# Altium schematic symbol library jlcpcb_2025_04_ferrites_extended_0603.schlib: 833 symbols (part 1 of 4) (continued)
## BLM18AG601BH1D
designator FB?  Impedance @ Frequency: 600Ω@100MHz
Ferrite, 600Ω@100MHz, ±25%, 380mΩ, 500mA, SMD 0603; Manufacturer: Murata Electronics; Manufacturer Part Number: BLM18AG601BH1D; Package Size: 0603; JLCPCB Basic Part: No; JLCPCB Part Number: C560054; Supplier 1: LCSC; Category: Ferrite Beads; Supplier Part Number 1: C560054; Tolerance: ±25%; Rated Current: 500mA; DC Resistance: 380mΩ; RoHS: Yes; ComponentLink1Description: Datasheet; ComponentLink1URL: https://wmsc.lcsc.com/wmsc/upload/file/pdf/v2/lcsc/2304140030_Murata-Electronics-BLM18AG601BH1D_C560054.pdf; ComponentLink2Description: JLCPCB Part URL; ComponentLink2URL: https://jlcpcb.com/partdetail/C560054; ComponentLink3Description: LCSC Part URL; ComponentLink3URL: https://lcsc.com/product-detail/Ferrite-Beads_Murata-Electronics-Murata-Electronics-BLM18AG601BH1D_C560054.html
footprint FB-0603 (0603 (1608M) Ferrite)
pins: 1, 2

## BLM18AG601SH1D
designator FB?  Impedance @ Frequency: 600Ω@100MHz
Ferrite, 600Ω@100MHz, ±25%, 380mΩ, 500mA, SMD 0603; Manufacturer: Murata Electronics; Manufacturer Part Number: BLM18AG601SH1D; Package Size: 0603; JLCPCB Basic Part: No; JLCPCB Part Number: C73225; Supplier 1: LCSC; Category: Ferrite Beads; Supplier Part Number 1: C73225; Tolerance: ±25%; Rated Current: 500mA; DC Resistance: 380mΩ; RoHS: Yes; ComponentLink1Description: Datasheet; ComponentLink1URL: https://wmsc.lcsc.com/wmsc/upload/file/pdf/v2/lcsc/1810311126_Murata-Electronics-BLM18AG601SH1D_C73225.pdf; ComponentLink2Description: JLCPCB Part URL; ComponentLink2URL: https://jlcpcb.com/partdetail/C73225; ComponentLink3Description: LCSC Part URL; ComponentLink3URL: https://lcsc.com/product-detail/Ferrite-Beads_Murata-Electronics-Murata-Electronics-BLM18AG601SH1D_C73225.html
footprint FB-0603 (0603 (1608M) Ferrite)
pins: 1, 2

## BLM18AG601SN1D
designator FB?  Impedance @ Frequency: 600Ω@100MHz
Ferrite, 600Ω@100MHz, ±25%, 380mΩ, 500mA, SMD 0603; Manufacturer: Murata Electronics; Manufacturer Part Number: BLM18AG601SN1D; Package Size: 0603; JLCPCB Basic Part: No; JLCPCB Part Number: C19330; Supplier 1: LCSC; Category: Ferrite Beads; Supplier Part Number 1: C19330; Tolerance: ±25%; Rated Current: 500mA; DC Resistance: 380mΩ; RoHS: Yes; ComponentLink1Description: Datasheet; ComponentLink1URL: https://wmsc.lcsc.com/wmsc/upload/file/pdf/v2/lcsc/2304140030_Murata-Electronics-BLM18AG601SN1D_C19330.pdf; ComponentLink2Description: JLCPCB Part URL; ComponentLink2URL: https://jlcpcb.com/partdetail/C19330; ComponentLink3Description: LCSC Part URL; ComponentLink3URL: https://lcsc.com/product-detail/Ferrite-Beads_Murata-Electronics-Murata-Electronics-BLM18AG601SN1D_C19330.html
footprint FB-0603 (0603 (1608M) Ferrite)
pins: 1, 2

## BLM18AG601SZ1D
designator FB?  Impedance @ Frequency: 600Ω@100MHz
Ferrite, 600Ω@100MHz, ±25%, 380mΩ, 500mA, SMD 0603; Manufacturer: Murata Electronics; Manufacturer Part Number: BLM18AG601SZ1D; Package Size: 0603; JLCPCB Basic Part: No; JLCPCB Part Number: C710353; Supplier 1: LCSC; Category: Ferrite Beads; Supplier Part Number 1: C710353; Tolerance: ±25%; Rated Current: 500mA; DC Resistance: 380mΩ; RoHS: Yes; ComponentLink1Description: Datasheet; ComponentLink1URL: https://wmsc.lcsc.com/wmsc/upload/file/pdf/v2/lcsc/2304140030_Murata-Electronics-BLM18AG601SZ1D_C710353.pdf; ComponentLink2Description: JLCPCB Part URL; ComponentLink2URL: https://jlcpcb.com/partdetail/C710353; ComponentLink3Description: LCSC Part URL; ComponentLink3URL: https://lcsc.com/product-detail/Ferrite-Beads_Murata-Electronics-Murata-Electronics-BLM18AG601SZ1D_C710353.html
footprint FB-0603 (0603 (1608M) Ferrite)
pins: 1, 2

## BLM18BA050SN1D
designator FB?  Impedance @ Frequency: 5Ω@100MHz
Ferrite, 5Ω@100MHz, ±25%, 200mΩ, 500mA, SMD 0603; Manufacturer: Murata Electronics; Manufacturer Part Number: BLM18BA050SN1D; Package Size: 0603; JLCPCB Basic Part: No; JLCPCB Part Number: C113011; Supplier 1: LCSC; Category: Ferrite Beads; Supplier Part Number 1: C113011; Tolerance: ±25%; Rated Current: 500mA; DC Resistance: 200mΩ; RoHS: Yes; ComponentLink1Description: Datasheet; ComponentLink1URL: https://wmsc.lcsc.com/wmsc/upload/file/pdf/v2/lcsc/2304140030_Murata-Electronics-BLM18BA050SN1D_C113011.pdf; ComponentLink2Description: JLCPCB Part URL; ComponentLink2URL: https://jlcpcb.com/partdetail/C113011; ComponentLink3Description: LCSC Part URL; ComponentLink3URL: https://lcsc.com/product-detail/Ferrite-Beads_Murata-Electronics-Murata-Electronics-BLM18BA050SN1D_C113011.html
footprint FB-0603 (0603 (1608M) Ferrite)
pins: 1, 2

## BLM18BA100SN1D
designator FB?  Impedance @ Frequency: 10Ω@100MHz
Ferrite, 10Ω@100MHz, ±25%, 250mΩ, 500mA, SMD 0603; Manufacturer: Murata Electronics; Manufacturer Part Number: BLM18BA100SN1D; Package Size: 0603; JLCPCB Basic Part: No; JLCPCB Part Number: C88973; Supplier 1: LCSC; Category: Ferrite Beads; Supplier Part Number 1: C88973; Tolerance: ±25%; Rated Current: 500mA; DC Resistance: 250mΩ; RoHS: Yes; ComponentLink1Description: Datasheet; ComponentLink1URL: https://wmsc.lcsc.com/wmsc/upload/file/pdf/v2/lcsc/2304140030_Murata-Electronics-BLM18BA100SN1D_C88973.pdf; ComponentLink2Description: JLCPCB Part URL; ComponentLink2URL: https://jlcpcb.com/partdetail/C88973; ComponentLink3Description: LCSC Part URL; ComponentLink3URL: https://lcsc.com/product-detail/Ferrite-Beads_Murata-Electronics-Murata-Electronics-BLM18BA100SN1D_C88973.html
footprint FB-0603 (0603 (1608M) Ferrite)
pins: 1, 2

## BLM18BA470SH1D
designator FB?  Impedance @ Frequency: 47Ω@100MHz
Ferrite, 47Ω@100MHz, ±25%, 550mΩ, 300mA, SMD 0603; Manufacturer: Murata Electronics; Manufacturer Part Number: BLM18BA470SH1D; Package Size: 0603; JLCPCB Basic Part: No; JLCPCB Part Number: C913680; Supplier 1: LCSC; Category: Ferrite Beads; Supplier Part Number 1: C913680; Tolerance: ±25%; Rated Current: 300mA; DC Resistance: 550mΩ; RoHS: Yes; ComponentLink1Description: Datasheet; ComponentLink1URL: https://wmsc.lcsc.com/wmsc/upload/file/pdf/v2/lcsc/2201131300_Murata-Electronics-BLM18BA470SH1D_C913680.pdf; ComponentLink2Description: JLCPCB Part URL; ComponentLink2URL: https://jlcpcb.com/partdetail/C913680; ComponentLink3Description: LCSC Part URL; ComponentLink3URL: https://lcsc.com/product-detail/Ferrite-Beads_Murata-Electronics-Murata-Electronics-BLM18BA470SH1D_C913680.html
footprint FB-0603 (0603 (1608M) Ferrite)
pins: 1, 2

## BLM18BA470SN1D
designator FB?  Impedance @ Frequency: 47Ω@100MHz
Ferrite, 47Ω@100MHz, ±25%, 550mΩ, 300mA, SMD 0603; Manufacturer: Murata Electronics; Manufacturer Part Number: BLM18BA470SN1D; Package Size: 0603; JLCPCB Basic Part: No; JLCPCB Part Number: C113014; Supplier 1: LCSC; Category: Ferrite Beads; Supplier Part Number 1: C113014; Tolerance: ±25%; Rated Current: 300mA; DC Resistance: 550mΩ; RoHS: Yes; ComponentLink1Description: Datasheet; ComponentLink1URL: https://wmsc.lcsc.com/wmsc/upload/file/pdf/v2/lcsc/2304140030_Murata-Electronics-BLM18BA470SN1D_C113014.pdf; ComponentLink2Description: JLCPCB Part URL; ComponentLink2URL: https://jlcpcb.com/partdetail/C113014; ComponentLink3Description: LCSC Part URL; ComponentLink3URL: https://lcsc.com/product-detail/Ferrite-Beads_Murata-Electronics-Murata-Electronics-BLM18BA470SN1D_C113014.html
footprint FB-0603 (0603 (1608M) Ferrite)
pins: 1, 2

## BLM18BA750SN1D
designator FB?  Impedance @ Frequency: 75Ω@100MHz
Ferrite, 75Ω@100MHz, ±25%, 700mΩ, 300mA, SMD 0603; Manufacturer: Murata Electronics; Manufacturer Part Number: BLM18BA750SN1D; Package Size: 0603; JLCPCB Basic Part: No; JLCPCB Part Number: C113015; Supplier 1: LCSC; Category: Ferrite Beads; Supplier Part Number 1: C113015; Tolerance: ±25%; Rated Current: 300mA; DC Resistance: 700mΩ; RoHS: Yes; ComponentLink1Description: Datasheet; ComponentLink1URL: https://wmsc.lcsc.com/wmsc/upload/file/pdf/v2/lcsc/2304140030_Murata-Electronics-BLM18BA750SN1D_C113015.pdf; ComponentLink2Description: JLCPCB Part URL; ComponentLink2URL: https://jlcpcb.com/partdetail/C113015; ComponentLink3Description: LCSC Part URL; ComponentLink3URL: https://lcsc.com/product-detail/Ferrite-Beads_Murata-Electronics-Murata-Electronics-BLM18BA750SN1D_C113015.html
footprint FB-0603 (0603 (1608M) Ferrite)
pins: 1, 2

## BLM18BB050SN1D
designator FB?  Impedance @ Frequency: 5Ω@100MHz
Ferrite, 5Ω@100MHz, ±25%, 50mΩ, 700mA, SMD 0603; Manufacturer: Murata Electronics; Manufacturer Part Number: BLM18BB050SN1D; Package Size: 0603; JLCPCB Basic Part: No; JLCPCB Part Number: C88974; Supplier 1: LCSC; Category: Ferrite Beads; Supplier Part Number 1: C88974; Tolerance: ±25%; Rated Current: 700mA; DC Resistance: 50mΩ; RoHS: Yes; ComponentLink1Description: Datasheet; ComponentLink1URL: https://wmsc.lcsc.com/wmsc/upload/file/pdf/v2/lcsc/2304140030_Murata-Electronics-BLM18BB050SN1D_C88974.pdf; ComponentLink2Description: JLCPCB Part URL; ComponentLink2URL: https://jlcpcb.com/partdetail/C88974; ComponentLink3Description: LCSC Part URL; ComponentLink3URL: https://lcsc.com/product-detail/Ferrite-Beads_Murata-Electronics-Murata-Electronics-BLM18BB050SN1D_C88974.html
footprint FB-0603 (0603 (1608M) Ferrite)
pins: 1, 2

## BLM18BB100SN1D
designator FB?  Impedance @ Frequency: 10Ω@100MHz
Ferrite, 10Ω@100MHz, ±25%, 100mΩ, 700mA, SMD 0603; Manufacturer: Murata Electronics; Manufacturer Part Number: BLM18BB100SN1D; Package Size: 0603; JLCPCB Basic Part: No; JLCPCB Part Number: C113016; Supplier 1: LCSC; Category: Ferrite Beads; Supplier Part Number 1: C113016; Tolerance: ±25%; Rated Current: 700mA; DC Resistance: 100mΩ; RoHS: Yes; ComponentLink1Description: Datasheet; ComponentLink1URL: https://wmsc.lcsc.com/wmsc/upload/file/pdf/v2/lcsc/2304140030_Murata-Electronics-BLM18BB100SN1D_C113016.pdf; ComponentLink2Description: JLCPCB Part URL; ComponentLink2URL: https://jlcpcb.com/partdetail/C113016; ComponentLink3Description: LCSC Part URL; ComponentLink3URL: https://lcsc.com/product-detail/Ferrite-Beads_Murata-Electronics-Murata-Electronics-BLM18BB100SN1D_C113016.html
footprint FB-0603 (0603 (1608M) Ferrite)
pins: 1, 2

## BLM18BB121SN1D
designator FB?  Impedance @ Frequency: 120Ω@100MHz
Ferrite, 120Ω@100MHz, ±25%, 300mΩ, 550mA, SMD 0603; Manufacturer: Murata Electronics; Manufacturer Part Number: BLM18BB121SN1D; Package Size: 0603; JLCPCB Basic Part: No; JLCPCB Part Number: C17141; Supplier 1: LCSC; Category: Ferrite Beads; Supplier Part Number 1: C17141; Tolerance: ±25%; Rated Current: 550mA; DC Resistance: 300mΩ; RoHS: Yes; ComponentLink1Description: Datasheet; ComponentLink1URL: https://wmsc.lcsc.com/wmsc/upload/file/pdf/v2/lcsc/2304140030_Murata-Electronics-BLM18BB121SN1D_C17141.pdf; ComponentLink2Description: JLCPCB Part URL; ComponentLink2URL: https://jlcpcb.com/partdetail/C17141; ComponentLink3Description: LCSC Part URL; ComponentLink3URL: https://lcsc.com/product-detail/Ferrite-Beads_Murata-Electronics-Murata-Electronics-BLM18BB121SN1D_C17141.html
footprint FB-0603 (0603 (1608M) Ferrite)
pins: 1, 2

## BLM18BB141SN1D
designator FB?  Impedance @ Frequency: 140Ω@100MHz
Ferrite, 140Ω@100MHz, ±25%, 350mΩ, 500mA, SMD 0603; Manufacturer: Murata Electronics; Manufacturer Part Number: BLM18BB141SN1D; Package Size: 0603; JLCPCB Basic Part: No; JLCPCB Part Number: C85825; Supplier 1: LCSC; Category: Ferrite Beads; Supplier Part Number 1: C85825; Tolerance: ±25%; Rated Current: 500mA; DC Resistance: 350mΩ; RoHS: Yes; ComponentLink1Description: Datasheet; ComponentLink1URL: https://wmsc.lcsc.com/wmsc/upload/file/pdf/v2/lcsc/2304140030_Murata-Electronics-BLM18BB141SN1D_C85825.pdf; ComponentLink2Description: JLCPCB Part URL; ComponentLink2URL: https://jlcpcb.com/partdetail/C85825; ComponentLink3Description: LCSC Part URL; ComponentLink3URL: https://lcsc.com/product-detail/Ferrite-Beads_Murata-Electronics-Murata-Electronics-BLM18BB141SN1D_C85825.html
footprint FB-0603 (0603 (1608M) Ferrite)
pins: 1, 2

## BLM18BB151SN1D
designator FB?  Impedance @ Frequency: 150Ω@100MHz
Ferrite, 150Ω@100MHz, 370mΩ, SMD 0603; Manufacturer: Murata Electronics; Manufacturer Part Number: BLM18BB151SN1D; Package Size: 0603; JLCPCB Basic Part: No; JLCPCB Part Number: C603122; Supplier 1: LCSC; Category: Ferrite Beads; Supplier Part Number 1: C603122; DC Resistance: 370mΩ; RoHS: Yes; ComponentLink1Description: Datasheet; ComponentLink1URL: https://wmsc.lcsc.com/wmsc/upload/file/pdf/v2/lcsc/2009091507_Murata-Electronics-BLM18BB151SN1D_C603122.pdf; ComponentLink2Description: JLCPCB Part URL; ComponentLink2URL: https://jlcpcb.com/partdetail/C603122; ComponentLink3Description: LCSC Part URL; ComponentLink3URL: https://lcsc.com/product-detail/Ferrite-Beads_Murata-Electronics-Murata-Electronics-BLM18BB151SN1D_C603122.html
pins: 1, 2

## BLM18BB220SN1D
designator FB?  Impedance @ Frequency: 22Ω@100MHz
Ferrite, 22Ω@100MHz, ±25%, 200mΩ, 700mA, SMD 0603; Manufacturer: Murata Electronics; Manufacturer Part Number: BLM18BB220SN1D; Package Size: 0603; JLCPCB Basic Part: No; JLCPCB Part Number: C88975; Supplier 1: LCSC; Category: Ferrite Beads; Supplier Part Number 1: C88975; Tolerance: ±25%; Rated Current: 700mA; DC Resistance: 200mΩ; RoHS: Yes; ComponentLink1Description: Datasheet; ComponentLink1URL: https://wmsc.lcsc.com/wmsc/upload/file/pdf/v2/lcsc/2304140030_Murata-Electronics-BLM18BB220SN1D_C88975.pdf; ComponentLink2Description: JLCPCB Part URL; ComponentLink2URL: https://jlcpcb.com/partdetail/C88975; ComponentLink3Description: LCSC Part URL; ComponentLink3URL: https://lcsc.com/product-detail/Ferrite-Beads_Murata-Electronics-Murata-Electronics-BLM18BB220SN1D_C88975.html
footprint FB-0603 (0603 (1608M) Ferrite)
pins: 1, 2

## BLM18BB221SN1D
designator FB?  Impedance @ Frequency: 220Ω@100MHz
Ferrite, 220Ω@100MHz, ±25%, 450mΩ, 450mA, SMD 0603; Manufacturer: Murata Electronics; Manufacturer Part Number: BLM18BB221SN1D; Package Size: 0603; JLCPCB Basic Part: No; JLCPCB Part Number: C85826; Supplier 1: LCSC; Category: Ferrite Beads; Supplier Part Number 1: C85826; Tolerance: ±25%; Rated Current: 450mA; DC Resistance: 450mΩ; RoHS: Yes; ComponentLink1Description: Datasheet; ComponentLink1URL: https://wmsc.lcsc.com/wmsc/upload/file/pdf/v2/lcsc/2304140030_Murata-Electronics-BLM18BB221SN1D_C85826.pdf; ComponentLink2Description: JLCPCB Part URL; ComponentLink2URL: https://jlcpcb.com/partdetail/C85826; ComponentLink3Description: LCSC Part URL; ComponentLink3URL: https://lcsc.com/product-detail/Ferrite-Beads_Murata-Electronics-Murata-Electronics-BLM18BB221SN1D_C85826.html
footprint FB-0603 (0603 (1608M) Ferrite)
pins: 1, 2

## BLM18BB331SN1D
designator FB?  Impedance @ Frequency: 330Ω@100MHz
Ferrite, 330Ω@100MHz, ±25%, 580mΩ, 400mA, SMD 0603; Manufacturer: Murata Electronics; Manufacturer Part Number: BLM18BB331SN1D; Package Size: 0603; JLCPCB Basic Part: No; JLCPCB Part Number: C113017; Supplier 1: LCSC; Category: Ferrite Beads; Supplier Part Number 1: C113017; Tolerance: ±25%; Rated Current: 400mA; DC Resistance: 580mΩ; RoHS: Yes; ComponentLink1Description: Datasheet; ComponentLink1URL: https://wmsc.lcsc.com/wmsc/upload/file/pdf/v2/lcsc/2304140030_Murata-Electronics-BLM18BB331SN1D_C113017.pdf; ComponentLink2Description: JLCPCB Part URL; ComponentLink2URL: https://jlcpcb.com/partdetail/C113017; ComponentLink3Description: LCSC Part URL; ComponentLink3URL: https://lcsc.com/product-detail/Ferrite-Beads_Murata-Electronics-Murata-Electronics-BLM18BB331SN1D_C113017.html
footprint FB-0603 (0603 (1608M) Ferrite)
pins: 1, 2

## BLM18BB470SN1D
designator FB?  Impedance @ Frequency: 47Ω@100MHz
Ferrite, 47Ω@100MHz, ±25%, 250mΩ, 600mA, SMD 0603; Manufacturer: Murata Electronics; Manufacturer Part Number: BLM18BB470SN1D; Package Size: 0603; JLCPCB Basic Part: No; JLCPCB Part Number: C113018; Supplier 1: LCSC; Category: Ferrite Beads; Supplier Part Number 1: C113018; Tolerance: ±25%; Rated Current: 600mA; DC Resistance: 250mΩ; RoHS: Yes; ComponentLink1Description: Datasheet; ComponentLink1URL: https://wmsc.lcsc.com/wmsc/upload/file/pdf/v2/lcsc/2304140030_Murata-Electronics-BLM18BB470SN1D_C113018.pdf; ComponentLink2Description: JLCPCB Part URL; ComponentLink2URL: https://jlcpcb.com/partdetail/C113018; ComponentLink3Description: LCSC Part URL; ComponentLink3URL: https://lcsc.com/product-detail/Ferrite-Beads_Murata-Electronics-Murata-Electronics-BLM18BB470SN1D_C113018.html
footprint FB-0603 (0603 (1608M) Ferrite)
pins: 1, 2

## BLM18BB471SN1D
designator FB?  Impedance @ Frequency: 470Ω@100MHz
Ferrite, 470Ω@100MHz, ±25%, 850mΩ, 300mA, SMD 0603; Manufacturer: Murata Electronics; Manufacturer Part Number: BLM18BB471SN1D; Package Size: 0603; JLCPCB Basic Part: No; JLCPCB Part Number: C113019; Supplier 1: LCSC; Category: Ferrite Beads; Supplier Part Number 1: C113019; Tolerance: ±25%; Rated Current: 300mA; DC Resistance: 850mΩ; RoHS: Yes; ComponentLink1Description: Datasheet; ComponentLink1URL: https://wmsc.lcsc.com/wmsc/upload/file/pdf/v2/lcsc/2304140030_Murata-Electronics-BLM18BB471SN1D_C113019.pdf; ComponentLink2Description: JLCPCB Part URL; ComponentLink2URL: https://jlcpcb.com/partdetail/C113019; ComponentLink3Description: LCSC Part URL; ComponentLink3URL: https://lcsc.com/product-detail/Ferrite-Beads_Murata-Electronics-Murata-Electronics-BLM18BB471SN1D_C113019.html
footprint FB-0603 (0603 (1608M) Ferrite)
pins: 1, 2

## BLM18BB600SN1D
designator FB?  Impedance @ Frequency: 60Ω@100MHz
Ferrite, 60Ω@100MHz, ±25%, 250mΩ, 600mA, SMD 0603; Manufacturer: Murata Electronics; Manufacturer Part Number: BLM18BB600SN1D; Package Size: 0603; JLCPCB Basic Part: No; JLCPCB Part Number: C237343; Supplier 1: LCSC; Category: Ferrite Beads; Supplier Part Number 1: C237343; Tolerance: ±25%; Rated Current: 600mA; DC Resistance: 250mΩ; RoHS: Yes; ComponentLink1Description: Datasheet; ComponentLink1URL: https://wmsc.lcsc.com/wmsc/upload/file/pdf/v2/lcsc/2304140030_Murata-Electronics-BLM18BB600SN1D_C237343.pdf; ComponentLink2Description: JLCPCB Part URL; ComponentLink2URL: https://jlcpcb.com/partdetail/C237343; ComponentLink3Description: LCSC Part URL; ComponentLink3URL: https://lcsc.com/product-detail/Ferrite-Beads_Murata-Electronics-Murata-Electronics-BLM18BB600SN1D_C237343.html
footprint FB-0603 (0603 (1608M) Ferrite)
pins: 1, 2

## BLM18BB600SZ1D
designator FB?  Impedance @ Frequency: 60Ω@100MHz
Ferrite, 60Ω@100MHz, ±25%, 250mΩ, 600mA, SMD 0603; Manufacturer: Murata Electronics; Manufacturer Part Number: BLM18BB600SZ1D; Package Size: 0603; JLCPCB Basic Part: No; JLCPCB Part Number: C882973; Supplier 1: LCSC; Category: Ferrite Beads; Supplier Part Number 1: C882973; Tolerance: ±25%; Rated Current: 600mA; DC Resistance: 250mΩ; RoHS: Yes; ComponentLink1Description: Datasheet; ComponentLink1URL: https://wmsc.lcsc.com/wmsc/upload/file/pdf/v2/lcsc/2011111205_Murata-Electronics-BLM18BB600SZ1D_C882973.pdf; ComponentLink2Description: JLCPCB Part URL; ComponentLink2URL: https://jlcpcb.com/partdetail/C882973; ComponentLink3Description: LCSC Part URL; ComponentLink3URL: https://lcsc.com/product-detail/Ferrite-Beads_Murata-Electronics-Murata-Electronics-BLM18BB600SZ1D_C882973.html
footprint FB-0603 (0603 (1608M) Ferrite)
pins: 1, 2

## BLM18BB750SN1D
designator FB?  Impedance @ Frequency: 75Ω@100MHz
Ferrite, 75Ω@100MHz, ±25%, 300mΩ, 600mA, SMD 0603; Manufacturer: Murata Electronics; Manufacturer Part Number: BLM18BB750SN1D; Package Size: 0603; JLCPCB Basic Part: No; JLCPCB Part Number: C476007; Supplier 1: LCSC; Category: Ferrite Beads; Supplier Part Number 1: C476007; Tolerance: ±25%; Rated Current: 600mA; DC Resistance: 300mΩ; RoHS: Yes; ComponentLink1Description: Datasheet; ComponentLink1URL: https://wmsc.lcsc.com/wmsc/upload/file/pdf/v2/lcsc/2304140030_Murata-Electronics-BLM18BB750SN1D_C476007.pdf; ComponentLink2Description: JLCPCB Part URL; ComponentLink2URL: https://jlcpcb.com/partdetail/C476007; ComponentLink3Description: LCSC Part URL; ComponentLink3URL: https://lcsc.com/product-detail/Ferrite-Beads_Murata-Electronics-Murata-Electronics-BLM18BB750SN1D_C476007.html
footprint FB-0603 (0603 (1608M) Ferrite)
pins: 1, 2

## BLM18BD102BH1D
designator FB?  Impedance @ Frequency: 1kΩ@100MHz
Ferrite, 1kΩ@100MHz, ±25%, 850mΩ, 200mA, SMD 0603; Manufacturer: Murata Electronics; Manufacturer Part Number: BLM18BD102BH1D; Package Size: 0603; JLCPCB Basic Part: No; JLCPCB Part Number: C907938; Supplier 1: LCSC; Category: Ferrite Beads; Supplier Part Number 1: C907938; Tolerance: ±25%; Rated Current: 200mA; DC Resistance: 850mΩ; RoHS: Yes; ComponentLink1Description: Datasheet; ComponentLink1URL: https://wmsc.lcsc.com/wmsc/upload/file/pdf/v2/lcsc/2109222030_Murata-Electronics-BLM18BD102BH1D_C907938.pdf; ComponentLink2Description: JLCPCB Part URL; ComponentLink2URL: https://jlcpcb.com/partdetail/C907938; ComponentLink3Description: LCSC Part URL; ComponentLink3URL: https://lcsc.com/product-detail/Ferrite-Beads_Murata-Electronics-Murata-Electronics-BLM18BD102BH1D_C907938.html
footprint FB-0603 (0603 (1608M) Ferrite)
pins: 1, 2

## BLM18BD102SH1D
designator FB?  Impedance @ Frequency: 1kΩ@100MHz
Ferrite, 1kΩ@100MHz, ±25%, 850mΩ, 200mA, SMD 0603; Manufacturer: Murata Electronics; Manufacturer Part Number: BLM18BD102SH1D; Package Size: 0603; JLCPCB Basic Part: No; JLCPCB Part Number: C437400; Supplier 1: LCSC; Category: Ferrite Beads; Supplier Part Number 1: C437400; Tolerance: ±25%; Rated Current: 200mA; DC Resistance: 850mΩ; RoHS: Yes; ComponentLink1Description: Datasheet; ComponentLink1URL: https://wmsc.lcsc.com/wmsc/upload/file/pdf/v2/lcsc/2304140030_Murata-Electronics-BLM18BD102SH1D_C437400.pdf; ComponentLink2Description: JLCPCB Part URL; ComponentLink2URL: https://jlcpcb.com/partdetail/C437400; ComponentLink3Description: LCSC Part URL; ComponentLink3URL: https://lcsc.com/product-detail/Ferrite-Beads_Murata-Electronics-Murata-Electronics-BLM18BD102SH1D_C437400.html
footprint FB-0603 (0603 (1608M) Ferrite)
pins: 1, 2

## BLM18BD102SN1D
designator FB?  Impedance @ Frequency: 1kΩ@100MHz
Ferrite, 1kΩ@100MHz, ±25%, 850mΩ, 200mA, SMD 0603; Manufacturer: Murata Electronics; Manufacturer Part Number: BLM18BD102SN1D; Package Size: 0603; JLCPCB Basic Part: No; JLCPCB Part Number: C78748; Supplier 1: LCSC; Category: Ferrite Beads; Supplier Part Number 1: C78748; Tolerance: ±25%; Rated Current: 200mA; DC Resistance: 850mΩ; RoHS: Yes; ComponentLink1Description: Datasheet; ComponentLink1URL: https://wmsc.lcsc.com/wmsc/upload/file/pdf/v2/lcsc/2304140030_Murata-Electronics-BLM18BD102SN1D_C78748.pdf; ComponentLink2Description: JLCPCB Part URL; ComponentLink2URL: https://jlcpcb.com/partdetail/C78748; ComponentLink3Description: LCSC Part URL; ComponentLink3URL: https://lcsc.com/product-detail/Ferrite-Beads_Murata-Electronics-Murata-Electronics-BLM18BD102SN1D_C78748.html
footprint FB-0603 (0603 (1608M) Ferrite)
pins: 1, 2

## BLM18BD121SN1D
designator FB?  Impedance @ Frequency: 120Ω@100MHz
Ferrite, 120Ω@100MHz, ±25%, 400mΩ, 300mA, SMD 0603; Manufacturer: Murata Electronics; Manufacturer Part Number: BLM18BD121SN1D; Package Size: 0603; JLCPCB Basic Part: No; JLCPCB Part Number: C97851; Supplier 1: LCSC; Category: Ferrite Beads; Supplier Part Number 1: C97851; Tolerance: ±25%; Rated Current: 300mA; DC Resistance: 400mΩ; RoHS: Yes; ComponentLink1Description: Datasheet; ComponentLink1URL: https://wmsc.lcsc.com/wmsc/upload/file/pdf/v2/lcsc/2304140030_Murata-Electronics-BLM18BD121SN1D_C97851.pdf; ComponentLink2Description: JLCPCB Part URL; ComponentLink2URL: https://jlcpcb.com/partdetail/C97851; ComponentLink3Description: LCSC Part URL; ComponentLink3URL: https://lcsc.com/product-detail/Ferrite-Beads_Murata-Electronics-Murata-Electronics-BLM18BD121SN1D_C97851.html
footprint FB-0603 (0603 (1608M) Ferrite)
pins: 1, 2

## BLM18BD151SN1D
designator FB?  Impedance @ Frequency: 150Ω@100MHz
Ferrite, 150Ω@100MHz, 400mΩ, SMD 0603; Manufacturer: Murata Electronics; Manufacturer Part Number: BLM18BD151SN1D; Package Size: 0603; JLCPCB Basic Part: No; JLCPCB Part Number: C603121; Supplier 1: LCSC; Category: Ferrite Beads; Supplier Part Number 1: C603121; DC Resistance: 400mΩ; RoHS: Yes; ComponentLink1Description: Datasheet; ComponentLink1URL: https://wmsc.lcsc.com/wmsc/upload/file/pdf/v2/lcsc/2304140030_Murata-Electronics-BLM18BD151SN1D_C603121.pdf; ComponentLink2Description: JLCPCB Part URL; ComponentLink2URL: https://jlcpcb.com/partdetail/C603121; ComponentLink3Description: LCSC Part URL; ComponentLink3URL: https://lcsc.com/product-detail/Ferrite-Beads_Murata-Electronics-Murata-Electronics-BLM18BD151SN1D_C603121.html
pins: 1, 2

## BLM18BD152SH1D
designator FB?  Impedance @ Frequency: 1.5kΩ@100MHz
Ferrite, 1.5kΩ@100MHz, ±25%, 1.2Ω, 150mA, SMD 0603; Manufacturer: Murata Electronics; Manufacturer Part Number: BLM18BD152SH1D; Package Size: 0603; JLCPCB Basic Part: No; JLCPCB Part Number: C907941; Supplier 1: LCSC; Category: Ferrite Beads; Supplier Part Number 1: C907941; Tolerance: ±25%; Rated Current: 150mA; DC Resistance: 1.2Ω; RoHS: Yes; ComponentLink1Description: Datasheet; ComponentLink1URL: https://wmsc.lcsc.com/wmsc/upload/file/pdf/v2/lcsc/2109221630_Murata-Electronics-BLM18BD152SH1D_C907941.pdf; ComponentLink2Description: JLCPCB Part URL; ComponentLink2URL: https://jlcpcb.com/partdetail/C907941; ComponentLink3Description: LCSC Part URL; ComponentLink3URL: https://lcsc.com/product-detail/Ferrite-Beads_Murata-Electronics-Murata-Electronics-BLM18BD152SH1D_C907941.html
footprint FB-0603 (0603 (1608M) Ferrite)
pins: 1, 2

## BLM18BD152SN1D
designator FB?  Impedance @ Frequency: 1.5kΩ@100MHz
Ferrite, 1.5kΩ@100MHz, 1.2Ω, SMD 0603; Manufacturer: Murata Electronics; Manufacturer Part Number: BLM18BD152SN1D; Package Size: 0603; JLCPCB Basic Part: No; JLCPCB Part Number: C596491; Supplier 1: LCSC; Category: Ferrite Beads; Supplier Part Number 1: C596491; DC Resistance: 1.2Ω; RoHS: Yes; ComponentLink1Description: Datasheet; ComponentLink1URL: https://wmsc.lcsc.com/wmsc/upload/file/pdf/v2/lcsc/2304140030_Murata-Electronics-BLM18BD152SN1D_C596491.pdf; ComponentLink2Description: JLCPCB Part URL; ComponentLink2URL: https://jlcpcb.com/partdetail/C596491; ComponentLink3Description: LCSC Part URL; ComponentLink3URL: https://lcsc.com/product-detail/Ferrite-Beads_Murata-Electronics-Murata-Electronics-BLM18BD152SN1D_C596491.html
pins: 1, 2

## BLM18BD182SN1D
designator FB?  Impedance @ Frequency: 1.8kΩ@100MHz
Ferrite, 1.8kΩ@100MHz, ±25%, 1.5Ω, 150mA, SMD 0603; Manufacturer: Murata Electronics; Manufacturer Part Number: BLM18BD182SN1D; Package Size: 0603; JLCPCB Basic Part: No; JLCPCB Part Number: C113020; Supplier 1: LCSC; Category: Ferrite Beads; Supplier Part Number 1: C113020; Tolerance: ±25%; Rated Current: 150mA; DC Resistance: 1.5Ω; RoHS: Yes; ComponentLink1Description: Datasheet; ComponentLink1URL: https://wmsc.lcsc.com/wmsc/upload/file/pdf/v2/lcsc/2304140030_Murata-Electronics-BLM18BD182SN1D_C113020.pdf; ComponentLink2Description: JLCPCB Part URL; ComponentLink2URL: https://jlcpcb.com/partdetail/C113020; ComponentLink3Description: LCSC Part URL; ComponentLink3URL: https://lcsc.com/product-detail/Ferrite-Beads_Murata-Electronics-Murata-Electronics-BLM18BD182SN1D_C113020.html
footprint FB-0603 (0603 (1608M) Ferrite)
pins: 1, 2

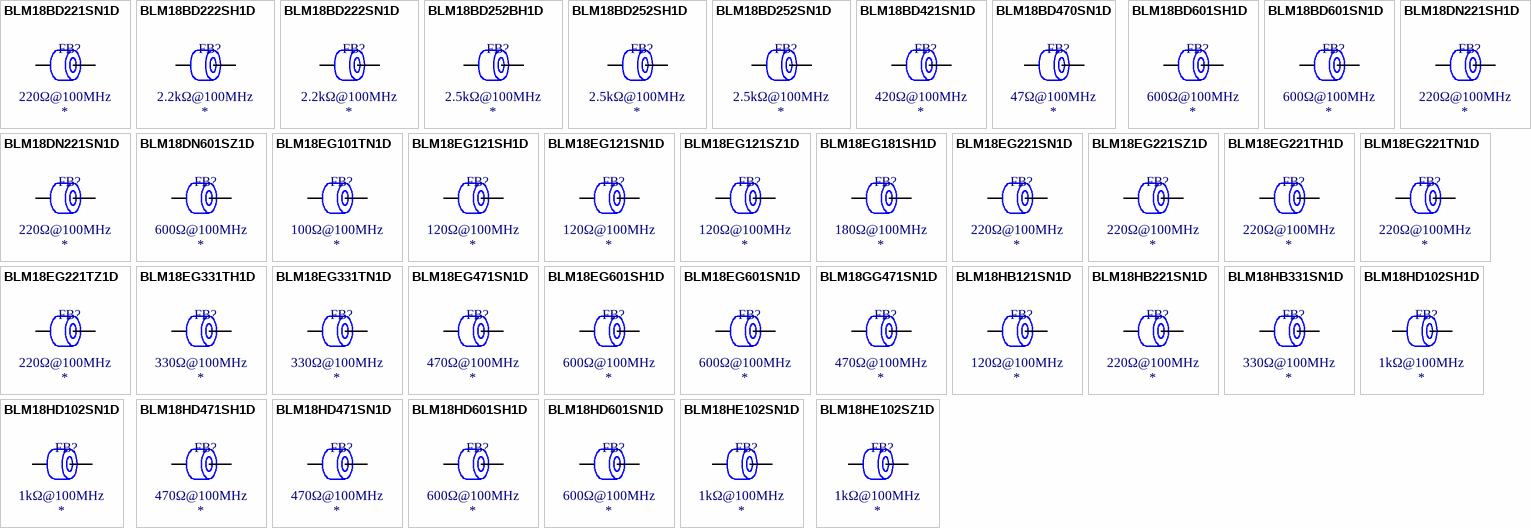
[diagram p2: symbols BLM18BD221SN1D to BLM18HE102SZ1D]

## BLM18BD221SN1D
designator FB?  Impedance @ Frequency: 220Ω@100MHz
Ferrite, 220Ω@100MHz, ±25%, 450mΩ, 250mA, SMD 0603; Manufacturer: Murata Electronics; Manufacturer Part Number: BLM18BD221SN1D; Package Size: 0603; JLCPCB Basic Part: No; JLCPCB Part Number: C113021; Supplier 1: LCSC; Category: Ferrite Beads; Supplier Part Number 1: C113021; Tolerance: ±25%; Rated Current: 250mA; DC Resistance: 450mΩ; RoHS: Yes; ComponentLink1Description: Datasheet; ComponentLink1URL: https://wmsc.lcsc.com/wmsc/upload/file/pdf/v2/lcsc/2304140030_Murata-Electronics-BLM18BD221SN1D_C113021.pdf; ComponentLink2Description: JLCPCB Part URL; ComponentLink2URL: https://jlcpcb.com/partdetail/C113021; ComponentLink3Description: LCSC Part URL; ComponentLink3URL: https://lcsc.com/product-detail/Ferrite-Beads_Murata-Electronics-Murata-Electronics-BLM18BD221SN1D_C113021.html
footprint FB-0603 (0603 (1608M) Ferrite)
pins: 1, 2

## BLM18BD222SH1D
designator FB?  Impedance @ Frequency: 2.2kΩ@100MHz
Ferrite, 2.2kΩ@100MHz, ±25%, 1.5Ω, 150mA, SMD 0603; Manufacturer: Murata Electronics; Manufacturer Part Number: BLM18BD222SH1D; Package Size: 0603; JLCPCB Basic Part: No; JLCPCB Part Number: C2661668; Supplier 1: LCSC; Category: Ferrite Beads; Supplier Part Number 1: C2661668; Tolerance: ±25%; Rated Current: 150mA; DC Resistance: 1.5Ω; RoHS: Yes; ComponentLink1Description: Datasheet; ComponentLink1URL: https://wmsc.lcsc.com/wmsc/upload/file/pdf/v2/lcsc/2108070930_Murata-Electronics-BLM18BD222SH1D_C2661668.pdf; ComponentLink2Description: JLCPCB Part URL; ComponentLink2URL: https://jlcpcb.com/partdetail/C2661668; ComponentLink3Description: LCSC Part URL; ComponentLink3URL: https://lcsc.com/product-detail/Ferrite-Beads_Murata-Electronics-Murata-Electronics-BLM18BD222SH1D_C2661668.html
footprint FB-0603 (0603 (1608M) Ferrite)
pins: 1, 2

## BLM18BD222SN1D
designator FB?  Impedance @ Frequency: 2.2kΩ@100MHz
Ferrite, 2.2kΩ@100MHz, ±25%, 1.5Ω, 150mA, SMD 0603; Manufacturer: Murata Electronics; Manufacturer Part Number: BLM18BD222SN1D; Package Size: 0603; JLCPCB Basic Part: No; JLCPCB Part Number: C113022; Supplier 1: LCSC; Category: Ferrite Beads; Supplier Part Number 1: C113022; Tolerance: ±25%; Rated Current: 150mA; DC Resistance: 1.5Ω; RoHS: Yes; ComponentLink1Description: Datasheet; ComponentLink1URL: https://wmsc.lcsc.com/wmsc/upload/file/pdf/v2/lcsc/2304140030_Murata-Electronics-BLM18BD222SN1D_C113022.pdf; ComponentLink2Description: JLCPCB Part URL; ComponentLink2URL: https://jlcpcb.com/partdetail/C113022; ComponentLink3Description: LCSC Part URL; ComponentLink3URL: https://lcsc.com/product-detail/Ferrite-Beads_Murata-Electronics-Murata-Electronics-BLM18BD222SN1D_C113022.html
footprint FB-0603 (0603 (1608M) Ferrite)
pins: 1, 2

## BLM18BD252BH1D
designator FB?  Impedance @ Frequency: 2.5kΩ@100MHz
Ferrite, 2.5kΩ@100MHz, ±25%, 1.5Ω, 150mA, SMD 0603; Manufacturer: Murata Electronics; Manufacturer Part Number: BLM18BD252BH1D; Package Size: 0603; JLCPCB Basic Part: No; JLCPCB Part Number: C710356; Supplier 1: LCSC; Category: Ferrite Beads; Supplier Part Number 1: C710356; Tolerance: ±25%; Rated Current: 150mA; DC Resistance: 1.5Ω; RoHS: Yes; ComponentLink1Description: Datasheet; ComponentLink1URL: https://wmsc.lcsc.com/wmsc/upload/file/pdf/v2/lcsc/2304140030_Murata-Electronics-BLM18BD252BH1D_C710356.pdf; ComponentLink2Description: JLCPCB Part URL; ComponentLink2URL: https://jlcpcb.com/partdetail/C710356; ComponentLink3Description: LCSC Part URL; ComponentLink3URL: https://lcsc.com/product-detail/Ferrite-Beads_Murata-Electronics-Murata-Electronics-BLM18BD252BH1D_C710356.html
footprint FB-0603 (0603 (1608M) Ferrite)
pins: 1, 2

## BLM18BD252SH1D
designator FB?  Impedance @ Frequency: 2.5kΩ@100MHz
Ferrite, 2.5kΩ@100MHz, ±25%, 1.5Ω, 150mA, SMD 0603; Manufacturer: Murata Electronics; Manufacturer Part Number: BLM18BD252SH1D; Package Size: 0603; JLCPCB Basic Part: No; JLCPCB Part Number: C710357; Supplier 1: LCSC; Category: Ferrite Beads; Supplier Part Number 1: C710357; Tolerance: ±25%; Rated Current: 150mA; DC Resistance: 1.5Ω; RoHS: Yes; ComponentLink1Description: Datasheet; ComponentLink1URL: https://wmsc.lcsc.com/wmsc/upload/file/pdf/v2/lcsc/2304140030_Murata-Electronics-BLM18BD252SH1D_C710357.pdf; ComponentLink2Description: JLCPCB Part URL; ComponentLink2URL: https://jlcpcb.com/partdetail/C710357; ComponentLink3Description: LCSC Part URL; ComponentLink3URL: https://lcsc.com/product-detail/Ferrite-Beads_Murata-Electronics-Murata-Electronics-BLM18BD252SH1D_C710357.html
footprint FB-0603 (0603 (1608M) Ferrite)
pins: 1, 2

## BLM18BD252SN1D
designator FB?  Impedance @ Frequency: 2.5kΩ@100MHz
Ferrite, 2.5kΩ@100MHz, ±25%, 1.5Ω, 150mA, SMD 0603; Manufacturer: Murata Electronics; Manufacturer Part Number: BLM18BD252SN1D; Package Size: 0603; JLCPCB Basic Part: No; JLCPCB Part Number: C77668; Supplier 1: LCSC; Category: Ferrite Beads; Supplier Part Number 1: C77668; Tolerance: ±25%; Rated Current: 150mA; DC Resistance: 1.5Ω; RoHS: Yes; ComponentLink1Description: Datasheet; ComponentLink1URL: https://wmsc.lcsc.com/wmsc/upload/file/pdf/v2/lcsc/2304140030_Murata-Electronics-BLM18BD252SN1D_C77668.pdf; ComponentLink2Description: JLCPCB Part URL; ComponentLink2URL: https://jlcpcb.com/partdetail/C77668; ComponentLink3Description: LCSC Part URL; ComponentLink3URL: https://lcsc.com/product-detail/Ferrite-Beads_Murata-Electronics-Murata-Electronics-BLM18BD252SN1D_C77668.html
footprint FB-0603 (0603 (1608M) Ferrite)
pins: 1, 2

## BLM18BD421SN1D
designator FB?  Impedance @ Frequency: 420Ω@100MHz
Ferrite, 420Ω@100MHz, ±25%, 550mΩ, 250mA, SMD 0603; Manufacturer: Murata Electronics; Manufacturer Part Number: BLM18BD421SN1D; Package Size: 0603; JLCPCB Basic Part: No; JLCPCB Part Number: C113023; Supplier 1: LCSC; Category: Ferrite Beads; Supplier Part Number 1: C113023; Tolerance: ±25%; Rated Current: 250mA; DC Resistance: 550mΩ; RoHS: Yes; ComponentLink1Description: Datasheet; ComponentLink1URL: https://wmsc.lcsc.com/wmsc/upload/file/pdf/v2/lcsc/2304140030_Murata-Electronics-BLM18BD421SN1D_C113023.pdf; ComponentLink2Description: JLCPCB Part URL; ComponentLink2URL: https://jlcpcb.com/partdetail/C113023; ComponentLink3Description: LCSC Part URL; ComponentLink3URL: https://lcsc.com/product-detail/Ferrite-Beads_Murata-Electronics-Murata-Electronics-BLM18BD421SN1D_C113023.html
footprint FB-0603 (0603 (1608M) Ferrite)
pins: 1, 2

## BLM18BD470SN1D
designator FB?  Impedance @ Frequency: 47Ω@100MHz
Ferrite, 47Ω@100MHz, ±25%, 300mΩ, 500mA, SMD 0603; Manufacturer: Murata Electronics; Manufacturer Part Number: BLM18BD470SN1D; Package Size: 0603; JLCPCB Basic Part: No; JLCPCB Part Number: C333843; Supplier 1: LCSC; Category: Ferrite Beads; Supplier Part Number 1: C333843; Tolerance: ±25%; Rated Current: 500mA; DC Resistance: 300mΩ; RoHS: Yes; ComponentLink1Description: Datasheet; ComponentLink1URL: https://wmsc.lcsc.com/wmsc/upload/file/pdf/v2/lcsc/2009291135_Murata-Electronics-BLM18BD470SN1D_C333843.pdf; ComponentLink2Description: JLCPCB Part URL; ComponentLink2URL: https://jlcpcb.com/partdetail/C333843; ComponentLink3Description: LCSC Part URL; ComponentLink3URL: https://lcsc.com/product-detail/Ferrite-Beads_Murata-Electronics-Murata-Electronics-BLM18BD470SN1D_C333843.html
footprint FB-0603 (0603 (1608M) Ferrite)
pins: 1, 2

## BLM18BD601SH1D
designator FB?  Impedance @ Frequency: 600Ω@100MHz
Ferrite, 600Ω@100MHz, ±25%, 650mΩ, 200mA, SMD 0603; Manufacturer: Murata Electronics; Manufacturer Part Number: BLM18BD601SH1D; Package Size: 0603; JLCPCB Basic Part: No; JLCPCB Part Number: C710359; Supplier 1: LCSC; Category: Ferrite Beads; Supplier Part Number 1: C710359; Tolerance: ±25%; Rated Current: 200mA; DC Resistance: 650mΩ; RoHS: Yes; ComponentLink1Description: Datasheet; ComponentLink1URL: https://wmsc.lcsc.com/wmsc/upload/file/pdf/v2/lcsc/2304140030_Murata-Electronics-BLM18BD601SH1D_C710359.pdf; ComponentLink2Description: JLCPCB Part URL; ComponentLink2URL: https://jlcpcb.com/partdetail/C710359; ComponentLink3Description: LCSC Part URL; ComponentLink3URL: https://lcsc.com/product-detail/Ferrite-Beads_Murata-Electronics-Murata-Electronics-BLM18BD601SH1D_C710359.html
footprint FB-0603 (0603 (1608M) Ferrite)
pins: 1, 2

## BLM18BD601SN1D
designator FB?  Impedance @ Frequency: 600Ω@100MHz
Ferrite, 600Ω@100MHz, ±25%, 650mΩ, 200mA, SMD 0603; Manufacturer: Murata Electronics; Manufacturer Part Number: BLM18BD601SN1D; Package Size: 0603; JLCPCB Basic Part: No; JLCPCB Part Number: C88976; Supplier 1: LCSC; Category: Ferrite Beads; Supplier Part Number 1: C88976; Tolerance: ±25%; Rated Current: 200mA; DC Resistance: 650mΩ; RoHS: Yes; ComponentLink1Description: Datasheet; ComponentLink1URL: https://wmsc.lcsc.com/wmsc/upload/file/pdf/v2/lcsc/2304140030_Murata-Electronics-BLM18BD601SN1D_C88976.pdf; ComponentLink2Description: JLCPCB Part URL; ComponentLink2URL: https://jlcpcb.com/partdetail/C88976; ComponentLink3Description: LCSC Part URL; ComponentLink3URL: https://lcsc.com/product-detail/Ferrite-Beads_Murata-Electronics-Murata-Electronics-BLM18BD601SN1D_C88976.html
footprint FB-0603 (0603 (1608M) Ferrite)
pins: 1, 2

## BLM18DN221SH1D
designator FB?  Impedance @ Frequency: 220Ω@100MHz
Ferrite, 220Ω@100MHz, SMD 0603; Manufacturer: Murata Electronics; Manufacturer Part Number: BLM18DN221SH1D; Package Size: 0603; JLCPCB Basic Part: No; JLCPCB Part Number: C2661695; Supplier 1: LCSC; Category: Ferrite Beads; Supplier Part Number 1: C2661695; RoHS: Yes; ComponentLink1Description: Datasheet; ComponentLink1URL: https://wmsc.lcsc.com/wmsc/upload/file/pdf/v2/lcsc/2308111547_Murata-Electronics-BLM18DN221SH1D_C2661695.pdf; ComponentLink2Description: JLCPCB Part URL; ComponentLink2URL: https://jlcpcb.com/partdetail/C2661695; ComponentLink3Description: LCSC Part URL; ComponentLink3URL: https://lcsc.com/product-detail/Ferrite-Beads_Murata-Electronics-Murata-Electronics-BLM18DN221SH1D_C2661695.html
pins: 1, 2

## BLM18DN221SN1D
designator FB?  Impedance @ Frequency: 220Ω@100MHz
Ferrite, 220Ω@100MHz, ±25%, 210mΩ, 1A, SMD 0603; Manufacturer: Murata Electronics; Manufacturer Part Number: BLM18DN221SN1D; Package Size: 0603; JLCPCB Basic Part: No; JLCPCB Part Number: C2661757; Supplier 1: LCSC; Category: Ferrite Beads; Supplier Part Number 1: C2661757; Tolerance: ±25%; Rated Current: 1A; DC Resistance: 210mΩ; RoHS: Yes; ComponentLink1Description: Datasheet; ComponentLink1URL: https://wmsc.lcsc.com/wmsc/upload/file/pdf/v2/lcsc/2106071736_Murata-Electronics-BLM18DN221SN1D_C2661757.pdf; ComponentLink2Description: JLCPCB Part URL; ComponentLink2URL: https://jlcpcb.com/partdetail/C2661757; ComponentLink3Description: LCSC Part URL; ComponentLink3URL: https://lcsc.com/product-detail/Ferrite-Beads_Murata-Electronics-Murata-Electronics-BLM18DN221SN1D_C2661757.html
footprint FB-0603 (0603 (1608M) Ferrite)
pins: 1, 2

## BLM18DN601SZ1D
designator FB?  Impedance @ Frequency: 600Ω@100MHz
Ferrite, 600Ω@100MHz, SMD 0603; Manufacturer: Murata Electronics; Manufacturer Part Number: BLM18DN601SZ1D; Package Size: 0603; JLCPCB Basic Part: No; JLCPCB Part Number: C3717088; Supplier 1: LCSC; Category: Ferrite Beads; Supplier Part Number 1: C3717088; RoHS: Yes; ComponentLink1Description: Datasheet; ComponentLink1URL: https://wmsc.lcsc.com/wmsc/upload/file/pdf/v2/lcsc/2308111738_Murata-Electronics-BLM18DN601SZ1D_C3717088.pdf; ComponentLink2Description: JLCPCB Part URL; ComponentLink2URL: https://jlcpcb.com/partdetail/C3717088; ComponentLink3Description: LCSC Part URL; ComponentLink3URL: https://lcsc.com/product-detail/Ferrite-Beads_Murata-Electronics-Murata-Electronics-BLM18DN601SZ1D_C3717088.html
pins: 1, 2

## BLM18EG101TN1D
designator FB?  Impedance @ Frequency: 100Ω@100MHz
Ferrite, 100Ω@100MHz, ±25%, 45mΩ, 2A, SMD 0603; Manufacturer: Murata Electronics; Manufacturer Part Number: BLM18EG101TN1D; Package Size: 0603; JLCPCB Basic Part: No; JLCPCB Part Number: C76893; Supplier 1: LCSC; Category: Ferrite Beads; Supplier Part Number 1: C76893; Tolerance: ±25%; Rated Current: 2A; DC Resistance: 45mΩ; RoHS: Yes; ComponentLink1Description: Datasheet; ComponentLink1URL: https://wmsc.lcsc.com/wmsc/upload/file/pdf/v2/lcsc/2304140030_Murata-Electronics-BLM18EG101TN1D_C76893.pdf; ComponentLink2Description: JLCPCB Part URL; ComponentLink2URL: https://jlcpcb.com/partdetail/C76893; ComponentLink3Description: LCSC Part URL; ComponentLink3URL: https://lcsc.com/product-detail/Ferrite-Beads_Murata-Electronics-Murata-Electronics-BLM18EG101TN1D_C76893.html
footprint FB-0603 (0603 (1608M) Ferrite)
pins: 1, 2

## BLM18EG121SH1D
designator FB?  Impedance @ Frequency: 120Ω@100MHz
Ferrite, 120Ω@100MHz, ±25%, 40mΩ, 2A, SMD 0603; Manufacturer: Murata Electronics; Manufacturer Part Number: BLM18EG121SH1D; Package Size: 0603; JLCPCB Basic Part: No; JLCPCB Part Number: C160979; Supplier 1: LCSC; Category: Ferrite Beads; Supplier Part Number 1: C160979; Tolerance: ±25%; Rated Current: 2A; DC Resistance: 40mΩ; RoHS: Yes; ComponentLink1Description: Datasheet; ComponentLink1URL: https://wmsc.lcsc.com/wmsc/upload/file/pdf/v2/lcsc/1810311132_Murata-Electronics-BLM18EG121SH1D_C160979.pdf; ComponentLink2Description: JLCPCB Part URL; ComponentLink2URL: https://jlcpcb.com/partdetail/C160979; ComponentLink3Description: LCSC Part URL; ComponentLink3URL: https://lcsc.com/product-detail/Ferrite-Beads_Murata-Electronics-Murata-Electronics-BLM18EG121SH1D_C160979.html
footprint FB-0603 (0603 (1608M) Ferrite)
pins: 1, 2

## BLM18EG121SN1D
designator FB?  Impedance @ Frequency: 120Ω@100MHz
Ferrite, 120Ω@100MHz, ±25%, 40mΩ, 2A, SMD 0603; Manufacturer: Murata Electronics; Manufacturer Part Number: BLM18EG121SN1D; Package Size: 0603; JLCPCB Basic Part: No; JLCPCB Part Number: C882954; Supplier 1: LCSC; Category: Ferrite Beads; Supplier Part Number 1: C882954; Tolerance: ±25%; Rated Current: 2A; DC Resistance: 40mΩ; RoHS: Yes; ComponentLink1Description: Datasheet; ComponentLink1URL: https://wmsc.lcsc.com/wmsc/upload/file/pdf/v2/lcsc/2201242130_Murata-Electronics-BLM18EG121SN1D_C882954.pdf; ComponentLink2Description: JLCPCB Part URL; ComponentLink2URL: https://jlcpcb.com/partdetail/C882954; ComponentLink3Description: LCSC Part URL; ComponentLink3URL: https://lcsc.com/product-detail/Ferrite-Beads_Murata-Electronics-Murata-Electronics-BLM18EG121SN1D_C882954.html
footprint FB-0603 (0603 (1608M) Ferrite)
pins: 1, 2

## BLM18EG121SZ1D
designator FB?  Impedance @ Frequency: 120Ω@100MHz
Ferrite, 120Ω@100MHz, ±25%, 40mΩ, 2A, SMD 0603; Manufacturer: Murata Electronics; Manufacturer Part Number: BLM18EG121SZ1D; Package Size: 0603; JLCPCB Basic Part: No; JLCPCB Part Number: C710362; Supplier 1: LCSC; Category: Ferrite Beads; Supplier Part Number 1: C710362; Tolerance: ±25%; Rated Current: 2A; DC Resistance: 40mΩ; RoHS: Yes; ComponentLink1Description: Datasheet; ComponentLink1URL: https://wmsc.lcsc.com/wmsc/upload/file/pdf/v2/lcsc/2304140030_Murata-Electronics-BLM18EG121SZ1D_C710362.pdf; ComponentLink2Description: JLCPCB Part URL; ComponentLink2URL: https://jlcpcb.com/partdetail/C710362; ComponentLink3Description: LCSC Part URL; ComponentLink3URL: https://lcsc.com/product-detail/Ferrite-Beads_Murata-Electronics-Murata-Electronics-BLM18EG121SZ1D_C710362.html
footprint FB-0603 (0603 (1608M) Ferrite)
pins: 1, 2

## BLM18EG181SH1D
designator FB?  Impedance @ Frequency: 180Ω@100MHz
Ferrite, 180Ω@100MHz, ±25%, 50mΩ, 2A, SMD 0603; Manufacturer: Murata Electronics; Manufacturer Part Number: BLM18EG181SH1D; Package Size: 0603; JLCPCB Basic Part: No; JLCPCB Part Number: C710363; Supplier 1: LCSC; Category: Ferrite Beads; Supplier Part Number 1: C710363; Tolerance: ±25%; Rated Current: 2A; DC Resistance: 50mΩ; RoHS: Yes; ComponentLink1Description: Datasheet; ComponentLink1URL: https://wmsc.lcsc.com/wmsc/upload/file/pdf/v2/lcsc/2304140030_Murata-Electronics-BLM18EG181SH1D_C710363.pdf; ComponentLink2Description: JLCPCB Part URL; ComponentLink2URL: https://jlcpcb.com/partdetail/C710363; ComponentLink3Description: LCSC Part URL; ComponentLink3URL: https://lcsc.com/product-detail/Ferrite-Beads_Murata-Electronics-Murata-Electronics-BLM18EG181SH1D_C710363.html
footprint FB-0603 (0603 (1608M) Ferrite)
pins: 1, 2

## BLM18EG221SN1D
designator FB?  Impedance @ Frequency: 220Ω@100MHz
Ferrite, 220Ω@100MHz, ±25%, 50mΩ, 2A, SMD 0603; Manufacturer: Murata Electronics; Manufacturer Part Number: BLM18EG221SN1D; Package Size: 0603; JLCPCB Basic Part: No; JLCPCB Part Number: C85827; Supplier 1: LCSC; Category: Ferrite Beads; Supplier Part Number 1: C85827; Tolerance: ±25%; Rated Current: 2A; DC Resistance: 50mΩ; RoHS: Yes; ComponentLink1Description: Datasheet; ComponentLink1URL: https://wmsc.lcsc.com/wmsc/upload/file/pdf/v2/lcsc/2304140030_Murata-Electronics-BLM18EG221SN1D_C85827.pdf; ComponentLink2Description: JLCPCB Part URL; ComponentLink2URL: https://jlcpcb.com/partdetail/C85827; ComponentLink3Description: LCSC Part URL; ComponentLink3URL: https://lcsc.com/product-detail/Ferrite-Beads_Murata-Electronics-Murata-Electronics-BLM18EG221SN1D_C85827.html
footprint FB-0603 (0603 (1608M) Ferrite)
pins: 1, 2

## BLM18EG221SZ1D
designator FB?  Impedance @ Frequency: 220Ω@100MHz
Ferrite, 220Ω@100MHz, ±25%, 50mΩ, 2A, SMD 0603; Manufacturer: Murata Electronics; Manufacturer Part Number: BLM18EG221SZ1D; Package Size: 0603; JLCPCB Basic Part: No; JLCPCB Part Number: C710364; Supplier 1: LCSC; Category: Ferrite Beads; Supplier Part Number 1: C710364; Tolerance: ±25%; Rated Current: 2A; DC Resistance: 50mΩ; RoHS: Yes; ComponentLink1Description: Datasheet; ComponentLink1URL: https://wmsc.lcsc.com/wmsc/upload/file/pdf/v2/lcsc/2304140030_Murata-Electronics-BLM18EG221SZ1D_C710364.pdf; ComponentLink2Description: JLCPCB Part URL; ComponentLink2URL: https://jlcpcb.com/partdetail/C710364; ComponentLink3Description: LCSC Part URL; ComponentLink3URL: https://lcsc.com/product-detail/Ferrite-Beads_Murata-Electronics-Murata-Electronics-BLM18EG221SZ1D_C710364.html
footprint FB-0603 (0603 (1608M) Ferrite)
pins: 1, 2

## BLM18EG221TH1D
designator FB?  Impedance @ Frequency: 220Ω@100MHz
Ferrite, 220Ω@100MHz, ±25%, 150mΩ, 1A, SMD 0603; Manufacturer: Murata Electronics; Manufacturer Part Number: BLM18EG221TH1D; Package Size: 0603; JLCPCB Basic Part: No; JLCPCB Part Number: C701156; Supplier 1: LCSC; Category: Ferrite Beads; Supplier Part Number 1: C701156; Tolerance: ±25%; Rated Current: 1A; DC Resistance: 150mΩ; RoHS: Yes; ComponentLink1Description: Datasheet; ComponentLink1URL: https://wmsc.lcsc.com/wmsc/upload/file/pdf/v2/lcsc/2009241508_Murata-Electronics-BLM18EG221TH1D_C701156.pdf; ComponentLink2Description: JLCPCB Part URL; ComponentLink2URL: https://jlcpcb.com/partdetail/C701156; ComponentLink3Description: LCSC Part URL; ComponentLink3URL: https://lcsc.com/product-detail/Ferrite-Beads_Murata-Electronics-Murata-Electronics-BLM18EG221TH1D_C701156.html
footprint FB-0603 (0603 (1608M) Ferrite)
pins: 1, 2

## BLM18EG221TN1D
designator FB?  Impedance @ Frequency: 220Ω@100MHz
Ferrite, 220Ω@100MHz, ±25%, 150mΩ, 1A, SMD 0603; Manufacturer: Murata Electronics; Manufacturer Part Number: BLM18EG221TN1D; Package Size: 0603; JLCPCB Basic Part: No; JLCPCB Part Number: C113025; Supplier 1: LCSC; Category: Ferrite Beads; Supplier Part Number 1: C113025; Tolerance: ±25%; Rated Current: 1A; DC Resistance: 150mΩ; RoHS: Yes; ComponentLink1Description: Datasheet; ComponentLink1URL: https://wmsc.lcsc.com/wmsc/upload/file/pdf/v2/lcsc/1810311110_Murata-Electronics-BLM18EG221TN1D_C113025.pdf; ComponentLink2Description: JLCPCB Part URL; ComponentLink2URL: https://jlcpcb.com/partdetail/C113025; ComponentLink3Description: LCSC Part URL; ComponentLink3URL: https://lcsc.com/product-detail/Ferrite-Beads_Murata-Electronics-Murata-Electronics-BLM18EG221TN1D_C113025.html
footprint FB-0603 (0603 (1608M) Ferrite)
pins: 1, 2
